# Altium footprint library Connector.PcbLib: 536 footprints (part 24 of 34)
Each footprint in its own frame and in the unit in brackets; x right, y up, seen from the top. Pads: shape width x height; smd on the part's side, far side on the other; paste and mask are expansions set on the pad; w line width, h text height; cw(c..) or ccw(c..) is an arc to the next point about the centre after c.
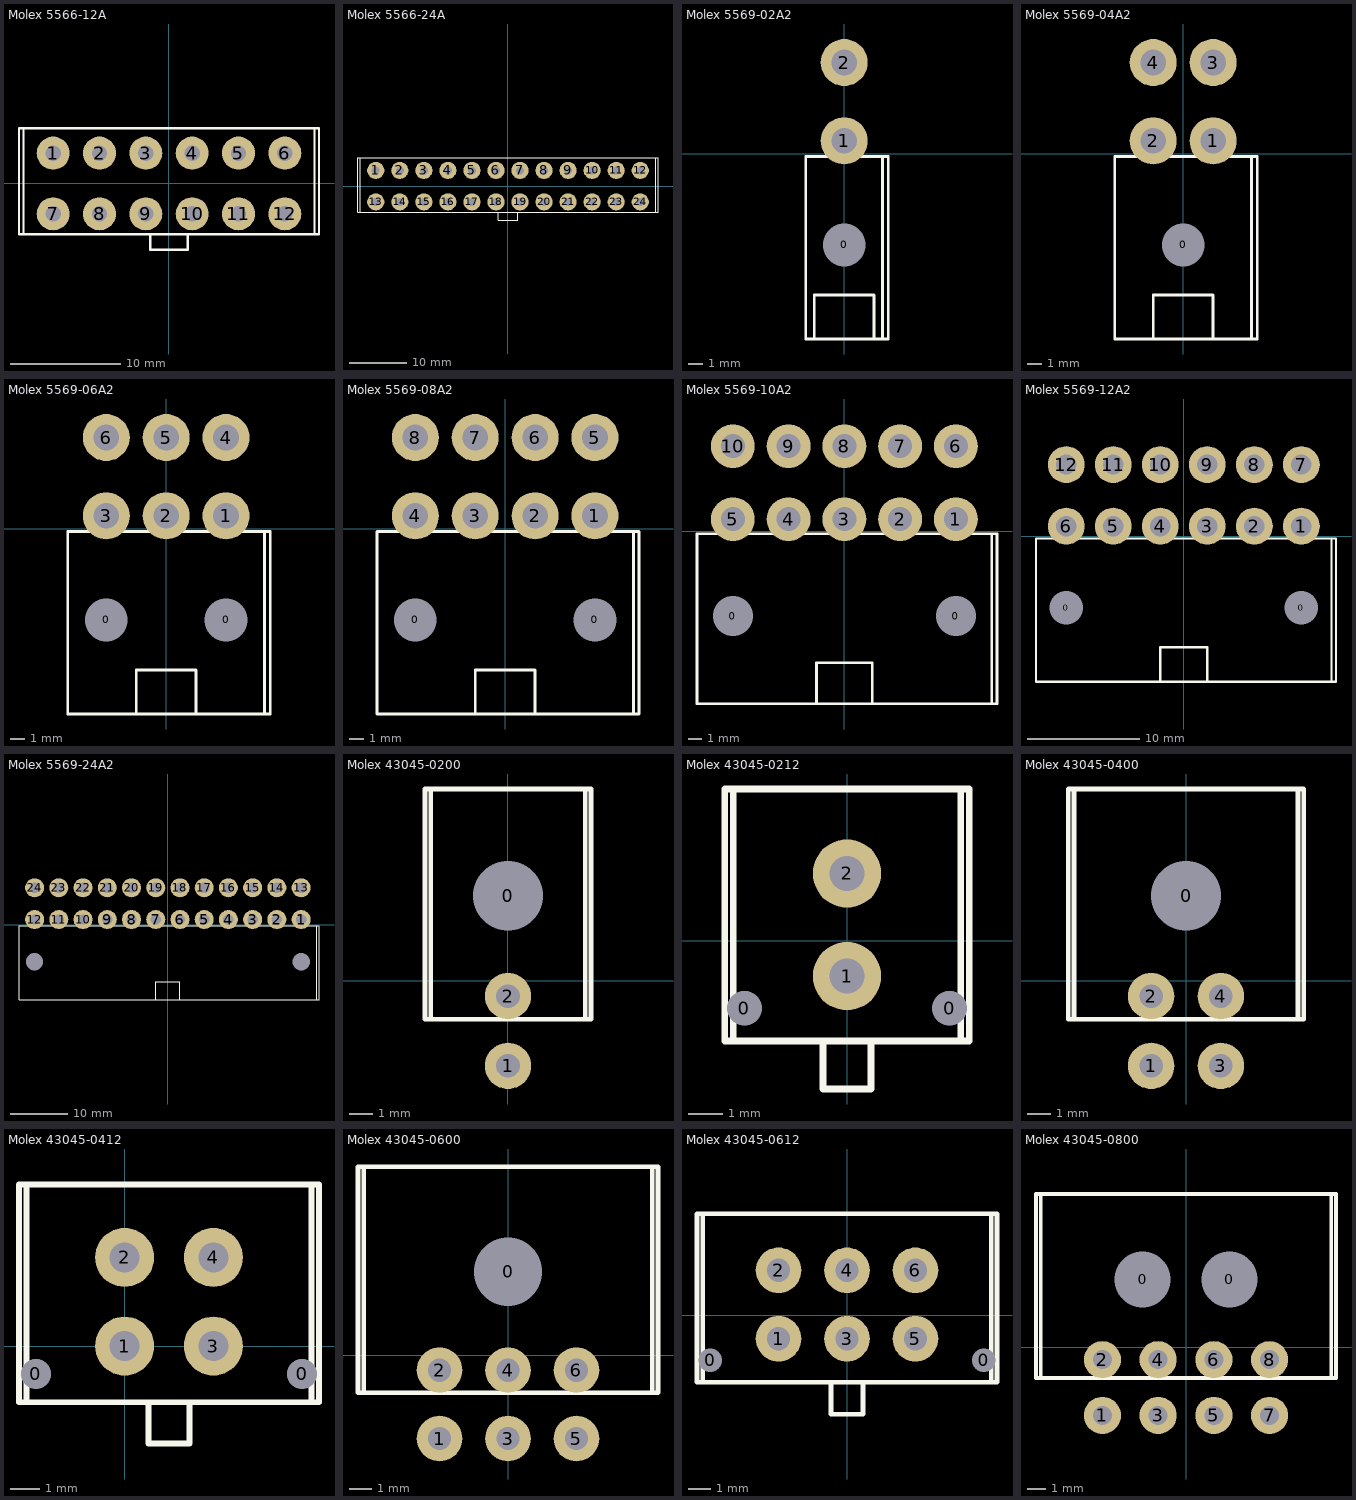
[diagram p23: the footprints below, top view; thin cyan lines are the x and y axes]

## Molex 5566-12A [mm]
pads (12):
  round 3 hole 1.4: 1(-10.5,2.75) 2(-6.3,2.75) 3(-2.1,2.75) 4(2.1,2.75) 5(6.3,2.75) 6(10.5,2.75) 7(-10.5,-2.75) 8(-6.3,-2.75) 9(-2.1,-2.75) 10(2.1,-2.75) 11(6.3,-2.75) 12(10.5,-2.75)
Top Overlay:
  lines w0.2: -1.7,-4.604 -1.7,-6 1.7,-6 1.7,-4.604 ; -13.2,-4.6 -13.2,5 ; -13.2,-4.6 13.2,-4.6 ; -13.2,-4.6 -13.599,-4.6 -13.599,5 -13.2,5 ; -13.2,5 13.2,5 ; 13.2,-4.6 13.599,-4.6 13.599,5 13.2,5 ; 13.2,-4.6 13.2,5
3D body "5566-12A .stp": height 12.8, standoff -3.5, extent -13.599,-6 13.601,5

## Molex 5566-24A [mm]
pads (24):
  round 3 hole 1.4: 1(-23.1,2.75) 2(-18.9,2.75) 3(-14.7,2.75) 4(-10.5,2.75) 5(-6.3,2.75) 6(-2.1,2.75) 7(2.1,2.75) 8(6.3,2.75) 9(10.5,2.75) 10(14.7,2.75) 11(18.9,2.75) 12(23.1,2.75) 13(-23.1,-2.75) 14(-18.9,-2.75) 15(-14.7,-2.75) 16(-10.5,-2.75) 17(-6.3,-2.75) 18(-2.1,-2.75) 19(2.1,-2.75) 20(6.3,-2.75) 21(10.5,-2.75) 22(14.7,-2.75) 23(18.9,-2.75) 24(23.1,-2.75)
Top Overlay:
  lines w0.2: -1.7,-4.604 -1.7,-6 1.7,-6 1.7,-4.604 ; 25.8,-4.6 25.8,5 ; -25.8,-4.6 -26.199,-4.6 -26.199,5 -25.8,5 ; -25.8,-4.6 26.199,-4.6 26.199,5 -25.8,5 ; -25.8,-4.6 -25.8,5
3D body "5566-24A.stp": height 12.8, standoff -3.5, extent -26.199,-6 26.201,5

## Molex 5569-02A2 [mm] "5569/5557"
pads (3):
  round 1 hole 3: 0(0,-6.4)
  round 3.3 hole 1.8: 1(0,0.9) 2(0,6.4)
Top Overlay:
  lines w0.2: -2.1,-13 -2.1,-9.907 2.1,-9.907 2.1,-13 ; 2.7,-13 3.099,-13 3.099,-0.2 2.7,-0.2 ; 2.7,-13 2.7,-0.2 ; 2.7,-13 -2.7,-13 -2.7,-0.2 2.7,-0.2
3D body "5569-02A2.stp": height 11.4, standoff -3.6, extent -2.7,-13 3.1,6.935

## Molex 5569-04A2 [mm] "5569/5557"
pads (5):
  round 1 hole 3: 0(0,-6.4)
  round 3.3 hole 1.8: 1(2.1,0.9) 2(-2.1,0.9) 3(2.1,6.4) 4(-2.1,6.4)
Top Overlay:
  lines w0.2: -2.1,-13 -2.1,-9.907 2.1,-9.907 2.1,-13 ; 4.8,-13 5.199,-13 5.199,-0.2 4.8,-0.2 ; 4.8,-13 4.8,-0.2 ; 4.8,-13 -4.8,-13 -4.8,-0.2 4.8,-0.2
3D body "5569-04A2.stp": height 11.4, standoff -3.6, extent -4.8,-13 5.2,6.935

## Molex 5569-06A2 [mm] "5569/5557"
pads (8):
  round 1 hole 3: 0(-4.2,-6.4) 0(4.2,-6.4)
  round 3.3 hole 1.8: 1(4.2,0.9) 2(0,0.9) 3(-4.2,0.9) 4(4.2,6.4) 5(0,6.4) 6(-4.2,6.4)
Top Overlay:
  lines w0.2: -2.1,-13 -2.1,-9.907 2.1,-9.907 2.1,-13 ; 6.9,-13 7.299,-13 7.299,-0.2 6.9,-0.2 ; 6.9,-13 6.9,-0.2 ; 6.9,-13 -6.9,-13 -6.9,-0.2 6.9,-0.2
3D body "5569-06A2.stp": height 11.4, standoff -3.6, extent -6.9,-13 7.3,6.935

## Molex 5569-08A2 [mm] "5569/5557"
pads (10):
  round 1 hole 3: 0(-6.3,-6.4) 0(6.3,-6.4)
  round 3.3 hole 1.8: 1(6.3,0.9) 2(2.1,0.9) 3(-2.1,0.9) 4(-6.3,0.9) 5(6.3,6.4) 6(2.1,6.4) 7(-2.1,6.4) 8(-6.3,6.4)
Top Overlay:
  lines w0.2: -2.1,-13 -2.1,-9.907 2.1,-9.907 2.1,-13 ; 9,-13 9.399,-13 9.399,-0.2 9,-0.2 ; 9,-13 9,-0.2 ; 9,-13 -9,-13 -9,-0.2 9,-0.2
3D body "5569-08A2.stp": height 11.4, standoff -3.6, extent -9,-13 9.4,6.935

## Molex 5569-10A2 [mm] "5569/5557"
pads (12):
  round 1 hole 3: 0(-8.4,-6.4) 0(8.4,-6.4)
  round 3.3 hole 1.8: 1(8.4,0.9) 2(4.2,0.9) 3(0,0.9) 4(-4.2,0.9) 5(-8.4,0.9) 6(8.4,6.4) 7(4.2,6.4) 8(0,6.4) 9(-4.2,6.4) 10(-8.4,6.4)
Top Overlay:
  lines w0.2: -2.1,-13 -2.1,-9.907 2.1,-9.907 2.1,-13 ; 11.1,-13 -11.1,-13 -11.1,-0.2 11.1,-0.2 ; 11.1,-13 11.1,-0.2 ; 11.1,-13 11.499,-13 11.499,-0.2 11.1,-0.2
3D body "5569-10A2.stp": height 11.4, standoff -3.6, extent -11.1,-13 11.5,6.935

## Molex 5569-12A2 [mm] "5569/5557"
pads (14):
  round 1 hole 3: 0(-10.5,-6.4) 0(10.5,-6.4)
  round 3.3 hole 1.8: 1(10.5,0.9) 2(6.3,0.9) 3(2.1,0.9) 4(-2.1,0.9) 5(-6.3,0.9) 6(-10.5,0.9) 7(10.5,6.4) 8(6.3,6.4) 9(2.1,6.4) 10(-2.1,6.4) 11(-6.3,6.4) 12(-10.5,6.4)
Top Overlay:
  lines w0.2: -2.1,-13 -2.1,-9.907 2.1,-9.907 2.1,-13 ; 13.2,-13 -13.2,-13 -13.2,-0.2 13.2,-0.2 ; 13.2,-13 13.2,-0.2 ; 13.2,-13 13.599,-13 13.599,-0.2 13.2,-0.2
3D body "5569-12A2.stp": height 11.4, standoff -3.6, extent -13.201,-13 13.599,6.935

## Molex 5569-24A2 [mm] "5569/5557"
pads (26):
  round 1 hole 3: 0(-23.1,-6.4) 0(23.1,-6.4)
  round 3.3 hole 1.8: 1(23.1,0.9) 2(18.9,0.9) 3(14.7,0.9) 4(10.5,0.9) 5(6.3,0.9) 6(2.1,0.9) 7(-2.1,0.9) 8(-6.3,0.9) 9(-10.5,0.9) 10(-14.7,0.9) 11(-18.9,0.9) 12(-23.1,0.9) 13(23.1,6.4) 14(18.9,6.4) 15(14.7,6.4) 16(10.5,6.4) 17(6.3,6.4) 18(2.1,6.4) 19(-2.1,6.4) 20(-6.3,6.4) 21(-10.5,6.4) 22(-14.7,6.4) 23(-18.9,6.4) 24(-23.1,6.4)
Top Overlay:
  lines w0.2: -2.1,-13 -2.1,-9.907 2.1,-9.907 2.1,-13 ; 25.8,-13 -25.8,-13 -25.8,-0.2 25.8,-0.2 ; 25.8,-13 25.8,-0.2 ; 25.8,-13 26.199,-13 26.199,-0.2 25.8,-0.2
3D body "5569-24A2.stp": height 11.4, standoff -3.6, extent -25.801,-13 26.199,6.935

## Molex 43045-0200 [mm] "Molex 43045-0200"
pads (3):
  round 1 hole 3: 0(0,3.66)
  round 2 hole 1.02: 1(0,-3.66) 2(0,-0.66)
Top Overlay:
  lines w0.2: -3.325,-1.65 -3.325,8.26 ; 3.325,-1.65 3.325,8.26 ; -3.575,-1.65 -3.575,8.26 3.575,8.26 3.575,-1.65 -3.575,-1.65
3D body "430450200.stp": height 8.83, standoff -3.12, extent -3.575,-3.98 3.575,8.26

## Molex 43045-0212 [mm]
pads (4):
  round 1 hole 1.02: 0(-3,-1.97) 0(3,-1.97)
  round 2 hole 1.02: 1(0,-1.03) 2(0,1.97)
Top Overlay:
  lines w0.2: -3.325,-2.93 -3.325,4.44 ; -0.7,-2.93 -0.7,-4.33 0.7,-4.33 0.7,-2.93 ; 3.325,-2.93 3.325,4.44 ; -3.575,-2.93 -3.575,4.44 3.575,4.44 3.575,-2.93 -3.575,-2.93
3D body "430450212.stp": height 9.95, standoff -3.14, extent -3.575,-4.33 3.575,4.44

## Molex 43045-0400 [mm] "43045-0400"
pads (5):
  round 1 hole 3: 0(0,3.66)
  round 2 hole 1.02: 1(-1.5,-3.66) 2(-1.5,-0.66) 3(1.5,-3.66) 4(1.5,-0.66)
Top Overlay:
  lines w0.2: -4.825,-1.65 -4.825,8.26 ; 4.825,-1.65 4.825,8.26 ; -5.075,-1.65 -5.075,8.26 5.075,8.26 5.075,-1.65 -5.075,-1.65
3D body "430450400.stp": height 8.83, standoff -3.12, extent -5.075,-3.98 5.075,8.26

## Molex 43045-0412 [mm]
pads (6):
  round 1 hole 1.02: 0(-3,-0.94) 0(6,-0.94)
  round 2 hole 1.02: 1(0,0) 2(0,3) 3(3,0) 4(3,3)
Top Overlay:
  lines w0.2: -3.325,-1.9 -3.325,5.47 ; 0.8,-1.9 0.8,-3.3 2.2,-3.3 2.2,-1.9 ; 6.325,-1.9 6.325,5.47 ; -3.575,-1.9 -3.575,5.47 6.575,5.47 6.575,-1.9 -3.575,-1.9
3D body "430450412.stp": height 9.95, standoff -3.14, extent -3.575,-3.3 6.575,5.47

## Molex 43045-0600 [mm] "43045-0400"
pads (7):
  round 1 hole 3: 0(0,3.66)
  round 2 hole 1.02: 1(-3,-3.66) 2(-3,-0.66) 3(0,-3.66) 4(0,-0.66) 5(3,-3.66) 6(3,-0.66)
Top Overlay:
  lines w0.2: -6.325,-1.65 -6.325,8.26 ; 6.325,-1.65 6.325,8.26 ; -6.575,-1.65 6.575,-1.65 6.575,8.26 -6.575,8.26 -6.575,-1.65
3D body "430450600.stp": height 8.83, standoff -3.12, extent -6.575,-3.98 6.575,8.26

## Molex 43045-0612 [mm]
pads (8):
  round 1 hole 1.02: 0(-6,-1.97) 0(6,-1.97)
  round 2 hole 1.02: 1(-3,-1.03) 2(-3,1.97) 3(0,-1.03) 4(0,1.97) 5(3,-1.03) 6(3,1.97)
Top Overlay:
  lines w0.2: -6.325,-2.93 -6.325,4.44 ; -0.7,-2.93 -0.7,-4.33 0.7,-4.33 0.7,-2.93 ; 6.325,-2.93 6.325,4.44 ; -6.575,-2.93 -6.575,4.44 6.575,4.44 6.575,-2.93 -6.575,-2.93

## Molex 43045-0800 [mm] "43045-0400"
pads (10):
  round 1 hole 3: 0(-2.34,3.66) 0(2.34,3.66)
  round 2 hole 1.02: 1(-4.5,-3.66) 2(-4.5,-0.66) 3(-1.5,-3.66) 4(-1.5,-0.66) 5(1.5,-3.66) 6(1.5,-0.66) 7(4.5,-3.66) 8(4.5,-0.66)
Top Overlay:
  lines w0.2: -7.825,-1.65 -7.825,8.26 ; 7.825,-1.65 7.825,8.26 ; -8.075,-1.65 -8.075,8.26 8.075,8.26 8.075,-1.65 -8.075,-1.65
3D body "430450800.stp": height 8.83, standoff -3.12, extent -8.075,-3.98 8.075,8.26